# Altium footprint library TinyShuffle v.0.PcbLib: 31 footprints (part 2 of 2)
Each footprint in its own frame and in the unit in brackets; x right, y up, seen from the top. Pads: shape width x height; smd on the part's side, far side on the other; paste and mask are expansions set on the pad; w line width, h text height; cw(c..) or ccw(c..) is an arc to the next point about the centre after c.
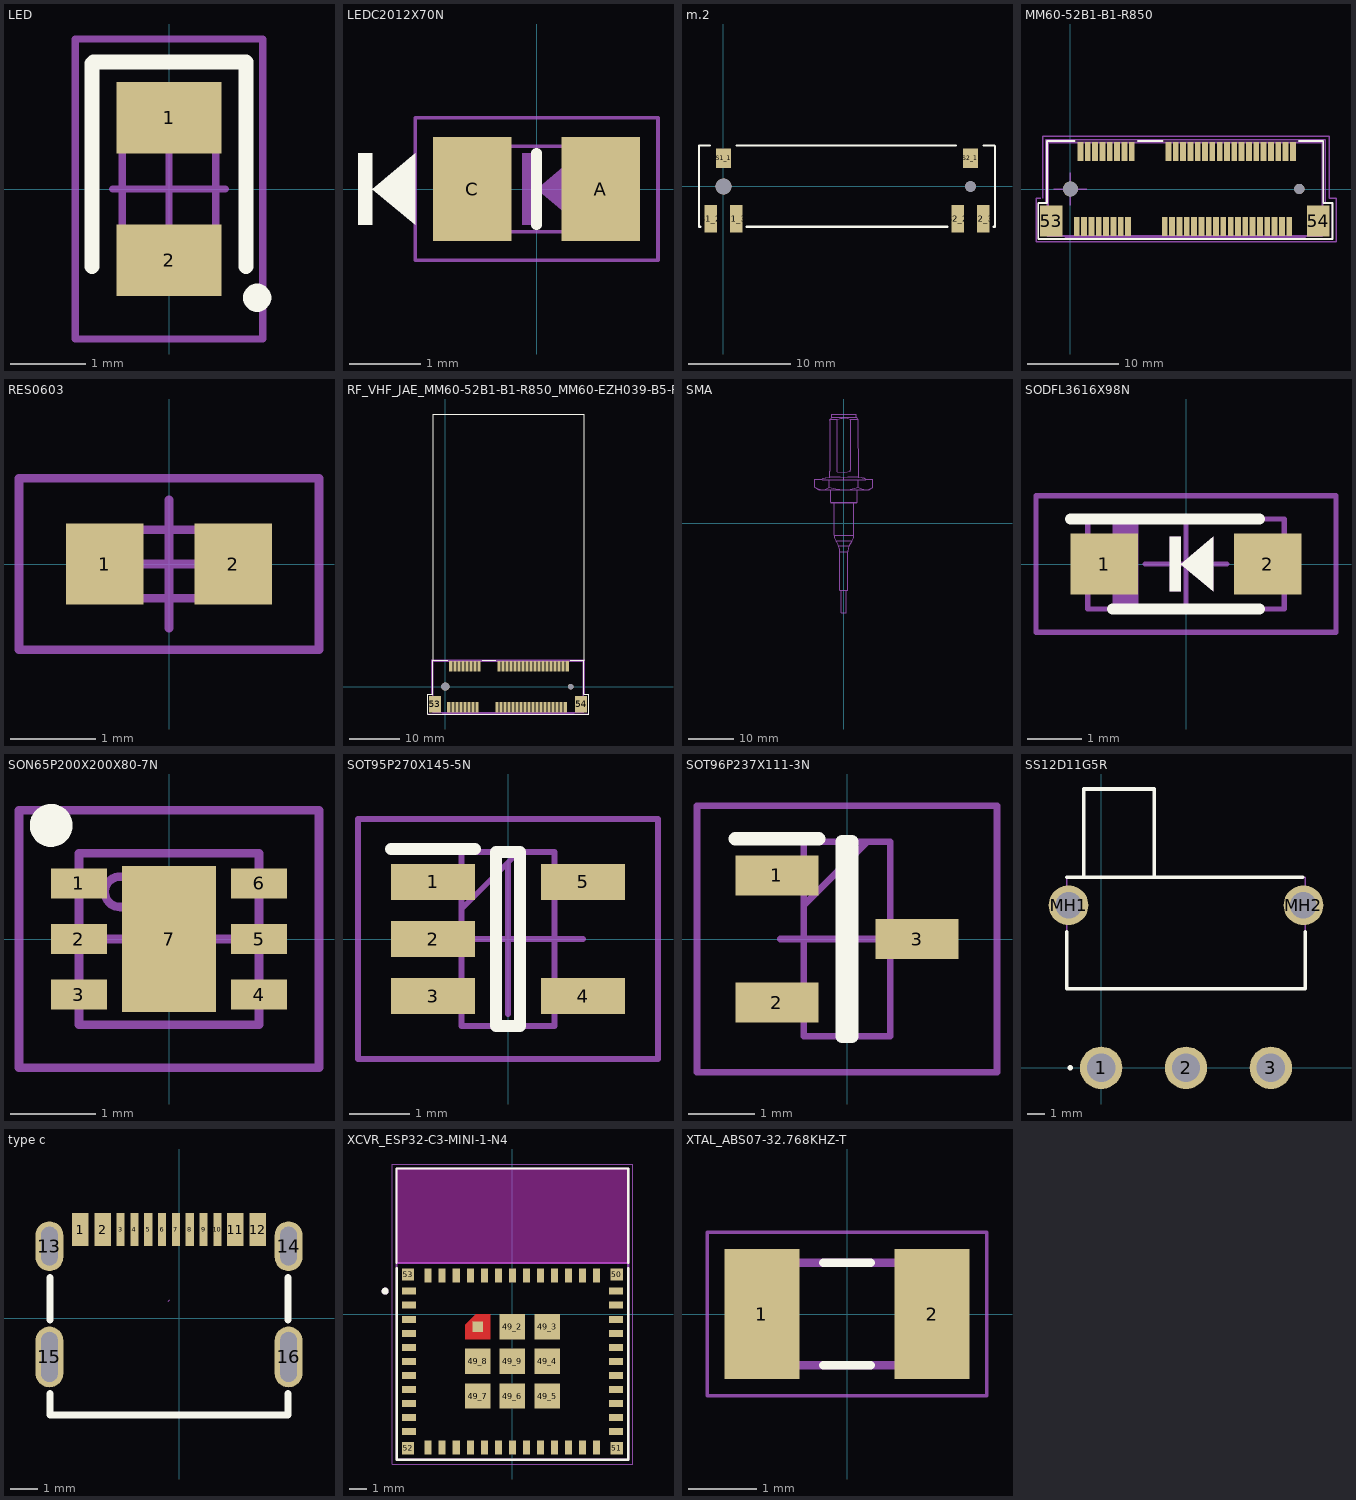
[diagram p1: the footprints below, top view; thin cyan lines are the x and y axes]

## LED [mm]
pads (2):
  rect 1.4x0.95 smd: 1(0,0.95) 2(0,-0.95)
Top Overlay:
  circle w0.254: c1.175,-1.45 r0.062
  lines w0.2: -1.025,-1.034 -1.025,1.675 -1.009,1.691 1.025,1.691 1.025,-1.034
Top Component Outline:
  lines w0.1: -0.625,-1 -0.625,1 0.625,1 0.625,-1 -0.625,-1
Top Courtyard (Mech15):
  lines w0.1: -0.75,0 0,0 ; 0,-0.75 0,0 ; 0,0.75 0,0 ; 0.75,0 0,0 ; -1.25,-2 1.25,-2 1.25,2 -1.25,2 -1.25,-2
3D body "User Library-KP-2012.STEP": height 1.1, standoff 0, extent -0.625,-1.001 0.625,1.001

## LEDC2012X70N [mm]
pads (2):
  rect 1.1x1.45 smd: A(0.9,0) C(-0.9,0)
Top Overlay:
  region: -2.5,0 -2.5,0.5 -2.3,0.5 -2.3,0
  region: -2.3,0 -1.7,0.5 -1.7,0
  region: -2.5,0 -2.5,-0.5 -2.3,-0.5 -2.3,0
  region: -2.3,0 -1.7,-0.5 -1.7,0
  lines w0.152: 0,-0.5 0,0.5
Top Component Outline:
  region: -0.2,0 -0.2,0.5 0,0.5 0,0
  region: 0,0 0.6,0.5 0.6,0
  region: -0.2,0 -0.2,-0.5 0,-0.5 0,0
  region: 0,0 0.6,-0.5 0.6,0
  region: -0.5,-0.6 -1,-0.6 -1,0.6 -0.5,0.6
  lines w0.05: -1,-0.6 1,-0.6 1,0.6 -1,0.6 -1,-0.6
Top Courtyard (Mech15):
  lines w0.05: -1.7,-1 1.7,-1 1.7,1 -1.7,1 -1.7,-1
3D body "LED_598-8110-107F_DIA.step": height 0.71, standoff 0, extent -1.003,-0.622 1.003,0.622

## m.2 [mm]
pads (8):
  rect 1.5x1.9 smd: S1_1(0.009,2.751) S2_1(24.209,2.751)
  rect 1.2x2.7 smd: S1_2(-1.241,-3.149) S1_3(1.259,-3.149) S2_2(22.959,-3.149) S2_3(25.459,-3.149)
  round 1.55 hole 1.55 unplated mask+0.102: ""(0.009,0.001)
  round 1.05 hole 1.05 unplated: ""(24.209,0.001)
Top Overlay:
  lines w0.2: -2.391,4 -2.391,-3.949 -2.241,-3.949 ; 2.259,-3.949 21.959,-3.949 ; 26.459,-3.949 26.609,-3.949 26.609,3.951
  lines w0.203: -2.391,4 -1.3,4 ; 1.3,4 22.8,4 ; 25.5,4 26.559,4
Mechanical 6:
  lines w0.127: 26.609,-3.949 26.609,3.951 26.609,-3.949
3D body "K3D-MM60-EZH039-B5-R2 JAE Connector Division Proprietary.STEP": height 4.7, standoff -0.9, extent -2.391,-3.924 26.609,3.976

## MM60-52B1-B1-R850 [mil] "PCIE CARD CONNECTOR"
height 45.67
pads (56):
  rect 25x83 smd mask+0.79: 1(27.56,-161.41) 2(43.31,161.42) 3(59.05,-161.41) 4(74.8,161.42) 5(90.55,-161.41) 6(106.3,161.42) 7(122.05,-161.41) 8(137.79,161.42) 9(153.54,-161.41) 10(169.29,161.42) 11(185.04,-161.41) 12(200.79,161.42) 13(216.53,-161.41) 14(232.28,161.42) 15(248.03,-161.41) 16(263.78,161.42) 17(405.51,-161.41) 18(421.26,161.42) 19(437.01,-161.41) 20(452.76,161.42) 21(468.5,-161.41) 22(484.25,161.42) 23(500,-161.41) 24(515.75,161.42) 25(531.5,-161.41) 26(547.24,161.42) 27(562.99,-161.41) 28(578.74,161.42) 29(594.49,-161.41) 30(610.24,161.42) 31(625.98,-161.41) 32(641.73,161.42) 33(657.48,-161.41) 34(673.23,161.42) 35(688.98,-161.41) 36(704.72,161.42) 37(720.47,-161.41) 38(736.22,161.42) 39(751.97,-161.41) 40(767.72,161.42) 41(783.46,-161.41) 42(799.21,161.42) 43(814.96,-161.41) 44(830.71,161.42) 45(846.46,-161.41) 46(862.2,161.42) 47(877.95,-161.41) 48(893.7,161.42) 49(909.45,-161.41) 50(925.2,161.42) 51(940.94,-161.41) 52(956.69,161.42)
  rect 96x132 smd: 53(-81.69,-137.79) 54(1065.94,-137.79)
  round 64.02 hole 64 unplated: ""(0,0)
  round 44.02 hole 44 unplated: ""(984.25,0)
Top Overlay:
  lines w7.99: 17.53,205.79 -100,205.79 -100,-60 -138,-60 -138,-215 1126,-215 1126,-60 1087,-60 1087,205.79 982.48,205.79 ; 289.56,205.79 395.48,205.79
Top Solder:
  region: 984.25,32.28 975.9,31.18 968.11,27.95 961.43,22.83 956.3,16.14 953.08,8.36 951.98,0 953.08,-8.35 956.3,-16.14 961.43,-22.82 968.11,-27.95 975.9,-31.17 984.25,-32.27 992.61,-31.17 1000.39,-27.95 1007.07,-22.82 1012.2,-16.14 1015.43,-8.35 1016.53,0 1015.43,8.36 1012.2,16.14 1007.07,22.83 1000.39,27.95 992.61,31.18
  region: 0,42.36 -10.96,40.92 -21.18,36.69 -29.95,29.95 -36.69,21.18 -40.92,10.96 -42.36,0 -40.92,-10.96 -36.69,-21.18 -29.95,-29.96 -21.18,-36.69 -10.96,-40.92 0,-42.36 10.96,-40.92 21.18,-36.69 29.95,-29.96 36.69,-21.18 40.92,-10.96 42.36,0 40.92,10.96 36.69,21.18 29.95,29.95 21.18,36.69 10.96,40.92
Top Component Outline:
  lines w5: -98.37,-203.21 1082.63,-203.21 1082.63,198.79 -98.37,198.79 -98.37,-203.21
  lines w6: -137.09,-213.16 -21.09,-213.16 -21.09,-210.58 1010.54,-210.58 1010.54,-213.16 1126.54,-213.16 1126.54,-61.16 1095.22,-61.16 1095.22,211.42 -106,211.42 -106,-61.16 -137.09,-61.16 -137.09,-213.16 ; -95.78,-200.58 1085.22,-200.58 1085.22,201.42 -95.78,201.42 -95.78,-200.58
Top Courtyard (Mech15):
  lines w5.91: -127.95,-39.37 -147.64,-39.37 -147.64,-226.38 1141.73,-226.38 1141.73,-39.37 1112.2,-39.37 1112.2,226.38 -118.11,226.38 -118.11,-39.37 ; -70.87,0 0,0 ; 0,-70.87 0,0 ; 0,70.87 0,0 ; 70.87,0 0,0
3D body "K3D-MM60-52B1-B1-R2 JAE Connector Division Proprietary.STEP": height 149.61, standoff -35.43, extent -92.92,-198.43 1076.37,195.27

## RES0603 [mm]
pads (2):
  rect 0.9x0.95 smd: 1(-0.75,0) 2(0.75,0)
Top Component Outline:
  lines w0.1: -0.775,-0.4 0.775,-0.4 0.775,0.4 -0.775,0.4 -0.775,-0.4
Top Courtyard (Mech15):
  lines w0.1: -0.75,0 0,0 ; 0,-0.75 0,0 ; 0,0.75 0,0 ; 0.75,0 0,0 ; -1.75,-1 0,-1 1.75,-1 1.75,1 -1.75,1 -1.75,-1
3D body "CPF0603B330RE1.stp": height 0.55, standoff 0, extent -0.775,-0.4 0.775,0.4

## RF_VHF_JAE_MM60-52B1-B1-R850_MM60-EZH039-B5-R850_w_2005_mPCIe_card [mil]
height 45.67
pads (56):
  rect 25x83 smd mask+0.79: 1(27.56,-161.41) 2(43.31,161.42) 3(59.05,-161.41) 4(74.8,161.42) 5(90.55,-161.41) 6(106.3,161.42) 7(122.05,-161.41) 8(137.79,161.42) 9(153.54,-161.41) 10(169.29,161.42) 11(185.04,-161.41) 12(200.79,161.42) 13(216.53,-161.41) 14(232.28,161.42) 15(248.03,-161.41) 16(263.78,161.42) 17(405.51,-161.41) 18(421.26,161.42) 19(437.01,-161.41) 20(452.76,161.42) 21(468.5,-161.41) 22(484.25,161.42) 23(500,-161.41) 24(515.75,161.42) 25(531.5,-161.41) 26(547.24,161.42) 27(562.99,-161.41) 28(578.74,161.42) 29(594.49,-161.41) 30(610.24,161.42) 31(625.98,-161.41) 32(641.73,161.42) 33(657.48,-161.41) 34(673.23,161.42) 35(688.98,-161.41) 36(704.72,161.42) 37(720.47,-161.41) 38(736.22,161.42) 39(751.97,-161.41) 40(767.72,161.42) 41(783.46,-161.41) 42(799.21,161.42) 43(814.96,-161.41) 44(830.71,161.42) 45(846.46,-161.41) 46(862.2,161.42) 47(877.95,-161.41) 48(893.7,161.42) 49(909.45,-161.41) 50(925.2,161.42) 51(940.94,-161.41) 52(956.69,161.42)
  rect 96x132 smd: 53(-81.69,-137.79) 54(1065.94,-137.79)
  round 64.02 hole 64 unplated: ""(0,0)
  round 44.02 hole 44 unplated: ""(984.25,0)
Top Overlay:
  lines w7.99: -100,204 -100,2140 ; -100,2140.6 1087,2140.6 1087,205 ; 17.53,205.79 -100,205.79 -100,-60 -138,-60 -138,-215 1126,-215 1126,-60 1087,-60 1087,205.79 982.48,205.79 ; 289.56,205.79 395.48,205.79
Top Solder:
  region: 984.25,32.28 975.9,31.18 968.11,27.95 961.43,22.83 956.3,16.14 953.08,8.36 951.98,0 953.08,-8.35 956.3,-16.14 961.43,-22.82 968.11,-27.95 975.9,-31.17 984.25,-32.27 992.61,-31.17 1000.39,-27.95 1007.07,-22.82 1012.2,-16.14 1015.43,-8.35 1016.53,0 1015.43,8.36 1012.2,16.14 1007.07,22.83 1000.39,27.95 992.61,31.18
  region: 0,42.36 -10.96,40.92 -21.18,36.69 -29.95,29.95 -36.69,21.18 -40.92,10.96 -42.36,0 -40.92,-10.96 -36.69,-21.18 -29.95,-29.96 -21.18,-36.69 -10.96,-40.92 0,-42.36 10.96,-40.92 21.18,-36.69 29.95,-29.96 36.69,-21.18 40.92,-10.96 42.36,0 40.92,10.96 36.69,21.18 29.95,29.95 21.18,36.69 10.96,40.92
Top Component Outline:
  lines w5: -98.37,-203.21 1082.63,-203.21 1082.63,198.79 -98.37,198.79 -98.37,-203.21
  lines w6: -137.09,-213.16 -21.09,-213.16 -21.09,-210.58 1010.54,-210.58 1010.54,-213.16 1126.54,-213.16 1126.54,-61.16 1095.22,-61.16 1095.22,211.42 -106,211.42 -106,-61.16 -137.09,-61.16 -137.09,-213.16 ; -95.78,-200.58 1085.22,-200.58 1085.22,201.42 -95.78,201.42 -95.78,-200.58
3D body "K3D-MM60-52B1-B1-R2 JAE Connector Division Proprietary.STEP": height 149.61, standoff -35.43, extent -92.92,-198.43 1076.37,195.27
3D body "TILE-LB_102120211208.step": height 271.74, standoff 69.61, extent -97.79,-3.35 1083.31,2002.56

## SMA [mm] "SMA CONNECTOR"
Top Component Outline:
  lines w0.05: -4.821,9.61 -4.504,9.908 -3.96,9.998 ; -3.955,10 cw(c-1.915,-14.405) 0,10.01 cw(c1.911,-15.771) 3.955,10 ; -3.175,9.51 -3.175,7.901 ; -3.095,22.676 -3.095,22.511 -3.085,11.387 -3.085,10.01 ; -3.092,22.682 -2.929,22.776 -2.722,22.895 ; -3.088,22.676 -3.084,22.685 -3.074,22.689 -3.052,22.695 -2.861,22.72 -1.41,22.72 ; -2.92,7.41 -2.92,4.6 ; -2.73,22.89 -2.73,23.007 -2.665,23.15 ; -2.159,4.5 -2.159,-2.555 ; -1.41,22.436 -1.41,11.346 0.178,11.213 1.41,11.452 1.41,11.617 1.382,22.733 ; -1.41,22.511 -1.41,22.72 ; -0.565,-14.55 -0.565,-19.55 0.565,-19.55 0.565,-14.55 ; 0,9.51 0,10.002 ; 2.159,4.5 2.159,-2.555 ; 2.92,7.41 2.92,4.6 ; 2.999,22.816 2.665,23.15 ; 3.097,10.01 2.994,22.811 2.997,22.809 2.998,22.806 2.996,22.805 2.991,22.803 2.973,22.799 2.906,22.791 1.382,22.733 ; 3.175,9.51 3.175,7.901 ; 3.96,9.998 4.393,9.958 4.819,9.61 ; -6.351,7.901 -5.642,7.568 -4.763,7.41 -4.075,7.508 -3.175,7.901 ; -6.351,7.901 -6.351,9.61 -4.76,9.61 -4.76,9.51 4.76,9.51 4.76,9.61 6.351,9.61 6.351,7.901 ; -6.351,7.901 -5.5,7.41 5.5,7.41 6.351,7.901 ; -3.175,7.901 -1.758,7.568 0,7.41 1.376,7.508 3.175,7.901 ; -2.92,4.6 2.92,4.6 ; -2.92,4.6 -2.82,4.5 2.82,4.5 2.92,4.6 ; -2.665,23.15 2.665,23.15 ; -2.665,23.15 -2.665,23.81 -2.565,23.91 2.565,23.91 2.665,23.81 2.665,23.15 ; -2.159,-2.555 ccw(c0.381,-2.555) -1.819,-3.825 ; -2.159,-2.555 2.159,-2.555 ; -1.819,-3.825 -1.219,-4.864 ; -1.819,-3.825 1.819,-3.825 ; -1.41,22.72 -1.023,22.876 -0.733,22.964 -0.324,23.024 0.202,23.053 0.846,22.933 1.382,22.733 ; -1.219,-4.864 cw(c-3.419,-6.134) -0.879,-6.134 ; -1.219,-4.864 1.219,-4.864 ; -0.879,-6.134 -0.879,-14.55 0.879,-14.55 0.879,-6.134 ; -0.879,-6.134 0.879,-6.134 ; 0.879,-6.134 cw(c3.419,-6.134) 1.219,-4.864 ; 1.219,-4.864 1.819,-3.825 ; 1.819,-3.825 ccw(c-0.381,-2.555) 2.159,-2.555 ; 3.175,7.901 3.884,7.568 4.763,7.41 5.451,7.508 6.351,7.901
3D body "336319-12-SMA.STEP": height 11.5, standoff 0.5, extent -6.351,-19.55 6.351,23.91

## SODFL3616X98N [mm]
pads (2):
  rect 1.24x1.12 smd: 1(-1.5,0) 2(1.5,0)
Top Overlay:
  region: -0.3,0 -0.3,0.5 -0.1,0.5 -0.1,0
  region: -0.1,0 0.5,0.5 0.5,0
  region: -0.3,0 -0.3,-0.5 -0.1,-0.5 -0.1,0
  region: -0.1,0 0.5,-0.5 0.5,0
  lines w0.2: -2.12,0.825 1.35,0.825 ; -1.35,-0.825 1.35,-0.825
Top Component Outline:
  rectangle: -1.35,-0.825 -0.875,0.825
  region: -0.3,0 -0.3,0.5 -0.1,0.5 -0.1,0
  region: -0.1,0 0.5,0.5 0.5,0
  region: -0.3,0 -0.3,-0.5 -0.1,-0.5 -0.1,0
  region: -0.1,0 0.5,-0.5 0.5,0
  lines w0.1: -1.8,-0.825 -1.8,0.825 1.8,0.825 1.8,-0.825 -1.8,-0.825
Top Courtyard (Mech15):
  lines w0.1: -0.75,0 0,0 ; 0,-0.75 0,0 ; 0,0.75 0,0 ; 0.75,0 0,0 ; -2.75,-1.25 -2.75,1.25 2.75,1.25 2.75,-1.25 0,-1.25 -2.75,-1.25
3D body "NRVB120VLSFT1G.stp": height 0.98, standoff 0, extent -1.8,-0.825 1.8,0.825

## SON65P200X200X80-7N [mm]
pads (7):
  rect 0.65x0.35 smd mask+0.05: 1(-1.05,0.65) 2(-1.05,0) 3(-1.05,-0.65) 4(1.05,-0.65) 5(1.05,0) 6(1.05,0.65)
  rect 1.1x1.7 smd mask+0: 7(0,0)
Top Overlay:
  circle w0.25: c-1.375,1.325 r0.125
Top Component Outline:
  circle w0.1: c-0.573,0.55 r0.177
  lines w0.1: -1.05,-1 1.05,-1 1.05,1 -1.05,1 -1.05,-1
Top Courtyard (Mech15):
  lines w0.1: -0.75,0 0,0 ; 0,-0.75 0,0 ; 0,0.75 0,0 ; 0.75,0 0,0 ; -1.75,-1.5 0,-1.5 1.75,-1.5 1.75,0 1.75,1.5 0,1.5 -1.75,1.5 -1.75,0 -1.75,-1.5
3D body "NCV8187AMT330TAG.stp": height 0.8, standoff 0, extent -1.05,-1 1.05,1

## SOT95P270X145-5N [mm]
pads (5):
  rect 1.4x0.6 smd: 1(-1.25,0.95) 2(-1.25,0) 3(-1.25,-0.95) 4(1.25,-0.95) 5(1.25,0.95)
Top Overlay:
  lines w0.2: -1.95,1.5 -0.55,1.5 ; -0.2,-1.45 0.2,-1.45 0.2,1.45 -0.2,1.45 -0.2,-1.45
Top Component Outline:
  lines w0.1: -0.775,0.5 0.175,1.45 ; -0.775,-1.45 0.775,-1.45 0.775,1.45 -0.775,1.45 -0.775,-1.45
Top Courtyard (Mech15):
  lines w0.1: -1.25,0 0,0 ; 0,-1.25 0,0 ; 0,1.25 0,0 ; 1.25,0 0,0 ; -2.5,-2 0,-2 2.5,-2 2.5,0 2.5,2 0,2 -2.5,2 -2.5,0 -2.5,-2
3D body "MCP73831T-2ACI_OT.stp": height 1.45, standoff 0, extent -1.35,-1.45 1.35,1.45

## SOT96P237X111-3N [mm]
pads (3):
  rect 1.25x0.6 smd: 1(-1.05,0.955) 2(-1.05,-0.955) 3(1.05,0)
Top Overlay:
  lines w0.2: -1.675,1.505 -0.425,1.505 ; -0.075,-1.46 -0.075,1.46 0.075,1.46 0.075,-1.46 -0.075,-1.46
Top Component Outline:
  lines w0.1: -0.65,0.505 0.305,1.46 ; -0.65,-1.46 -0.65,1.46 0.65,1.46 0.65,-1.46 -0.65,-1.46
Top Courtyard (Mech15):
  lines w0.1: -1,0 0,0 ; 0,-1 0,0 ; 0,1 0,0 ; 1,0 0,0 ; -2.25,-2 -2.25,0 -2.25,2 0,2 2.25,2 2.25,0 2.25,-2 0,-2 -2.25,-2
3D body "MMBT2222ALT1G.stp": height 1.11, standoff 0, extent -1.185,-1.46 1.185,1.46

## SS12D11G5R [mm]
pads (5):
  round 2.4 hole 1.6: 1(0,0) 2(4.8,0) 3(9.6,0)
  round 2.25 hole 1.5: MH1(-1.85,9.2) MH2(11.45,9.2)
Top Overlay:
  lines w0.2: -1.95,7.7 -1.95,4.48 11.55,4.48 11.55,7.7 ; -1.95,10.78 11.4,10.78 ; -1.8,0 ccw(c-1.75,0) -1.7,0 ; -1.8,0 cw(c-1.75,0) -1.7,0 ; -1.8,0 ccw(c-1.75,0) -1.7,0 ; -1,10.78 -1,15.78 3,15.78 3,10.78 -1,10.78
Top Component Outline:
  lines w0.1: -1.95,4.48 -1.95,10.78 11.55,10.78 11.55,4.48 -1.95,4.48

## type c [mm]
pads (16):
  rect 0.6x1.2 smd: 1(-3.579,3.203) 2(-2.779,3.203) 11(2.021,3.203) 12(2.821,3.203)
  rect 0.3x1.2 smd: 3(-2.129,3.203) 4(-1.629,3.203) 5(-1.129,3.203) 6(-0.629,3.203) 7(-0.129,3.203) 8(0.371,3.203) 9(0.871,3.203) 10(1.371,3.203)
  oval 1x1.8 hole 0.6 slot 1.4 at 90 deg: 13(-4.699,2.603) 14(3.941,2.603)
  oval 1x2.2 hole 0.6 slot 1.8 at 90 deg: 15(-4.699,-1.397) 16(3.941,-1.397)
Top Overlay:
  lines w0.254: -4.679,-2.728 -4.679,-3.497 3.921,-3.497 3.921,-2.728 ; -4.679,-0.066 -4.679,1.472 ; 3.921,-0.066 3.921,1.472
Top Courtyard (Mech15):
  lines w0.003: -0.404,0.621 -0.354,0.672

## XCVR_ESP32-C3-MINI-1-N4 [mm]
pads (61):
  rect 0.8x0.4 smd: 1(-5.9,1.3) 2(-5.9,0.5) 3(-5.9,-0.3) 4(-5.9,-1.1) 5(-5.9,-1.9) 6(-5.9,-2.7) 7(-5.9,-3.5) 8(-5.9,-4.3) 9(-5.9,-5.1) 10(-5.9,-5.9) 11(-5.9,-6.7) 25(5.9,-6.7) 26(5.9,-5.9) 27(5.9,-5.1) 28(5.9,-4.3) 29(5.9,-3.5) 30(5.9,-2.7) 31(5.9,-1.9) 32(5.9,-1.1) 33(5.9,-0.3) 34(5.9,0.5) 35(5.9,1.3)
  rect 0.4x0.8 smd: 12(-4.8,-7.6) 13(-4,-7.6) 14(-3.2,-7.6) 15(-2.4,-7.6) 16(-1.6,-7.6) 17(-0.8,-7.6) 18(0,-7.6) 19(0.8,-7.6) 20(1.6,-7.6) 21(2.4,-7.6) 22(3.2,-7.6) 23(4,-7.6) 24(4.8,-7.6) 36(4.8,2.2) 37(4,2.2) 38(3.2,2.2) 39(2.4,2.2) 40(1.6,2.2) 41(0.8,2.2) 42(0,2.2) 43(-0.8,2.2) 44(-1.6,2.2) 45(-2.4,2.2) 46(-3.2,2.2) 47(-4,2.2) 48(-4.8,2.2)
  rect 0.6x0.6 smd paste-1 mask+0: 49_1(-1.975,-0.725)
  rect 1.45x1.45 smd: 49_2(0,-0.725) 49_3(1.975,-0.725) 49_4(1.975,-2.7) 49_5(1.975,-4.675) 49_6(0,-4.675) 49_7(-1.975,-4.675) 49_8(-1.975,-2.7) 49_9(0,-2.7)
  rect 0.7x0.7 smd: 50(5.95,2.25) 51(5.95,-7.65) 52(-5.95,-7.65) 53(-5.95,2.25)
Top Layer:
  region: -1.25,-1.45 -2.7,-1.45 -2.7,-0.6 -2.1,0 -1.25,0
Top Overlay:
  circle w0.2: c-7.25,1.3 r0.1
  lines w0.127: -6.6,2.92 -6.6,8.3 6.6,8.3 6.6,2.92
  lines w0.152: -6.6,2.6 -6.6,-8.3 6.6,-8.3 6.6,2.6
Top Paste:
  region: -1.25,-1.45 -2.7,-1.45 -2.7,-0.6 -2.1,0 -1.25,0
Top Solder:
  region: -1.15,-1.55 -2.8,-1.55 -2.8,-0.56 -2.14,0.1 -1.15,0.1
Keep-Out Layer:
  region: 6.6,2.9 -6.6,2.9 -6.6,8.3 6.6,8.3
  region: 6.6,2.9 -6.6,2.9 -6.6,8.3 6.6,8.3
Top Component Outline:
  circle w0.2: c-7.25,1.3 r0.1
  lines w0.127: -6.6,2.9 -6.6,-8.3 6.6,-8.3 6.6,2.9 ; -6.6,2.9 -6.6,8.3 6.6,8.3 6.6,2.9 ; -6.6,2.9 6.6,2.9
Top Courtyard (Mech15):
  lines w0.05: -6.85,-8.55 -6.85,8.55 6.85,8.55 6.85,-8.55 -6.85,-8.55
3D body "step_temp.STEP": height 2.55, standoff 0, extent -6.6,-8.3 6.6,8.3

## XTAL_ABS07-32.768KHZ-T [mm]
pads (2):
  rect 1.1x1.9 smd: 1(-1.25,0) 2(1.25,0)
Top Overlay:
  lines w0.127: -0.35,-0.75 0.35,-0.75 ; -0.35,0.75 0.35,0.75
Top Component Outline:
  lines w0.127: -1.6,-0.75 -1.6,0.75 1.6,0.75 1.6,-0.75 -1.6,-0.75
Top Courtyard (Mech15):
  lines w0.05: -2.05,-1.2 -2.05,1.2 2.05,1.2 2.05,-1.2 -2.05,-1.2
3D body "ABS07-32.768KHZ-T--3DModel-STEP-400430.STEP": height 0.89, standoff 0, extent -1.6,-0.749 1.6,0.749